# Altium footprint library PcbLib.PcbLib: 108 footprints (part 4 of 7)
Each footprint in its own frame and in the unit in brackets; x right, y up, seen from the top. Pads: shape width x height; smd on the part's side, far side on the other; paste and mask are expansions set on the pad; w line width, h text height; cw(c..) or ccw(c..) is an arc to the next point about the centre after c.
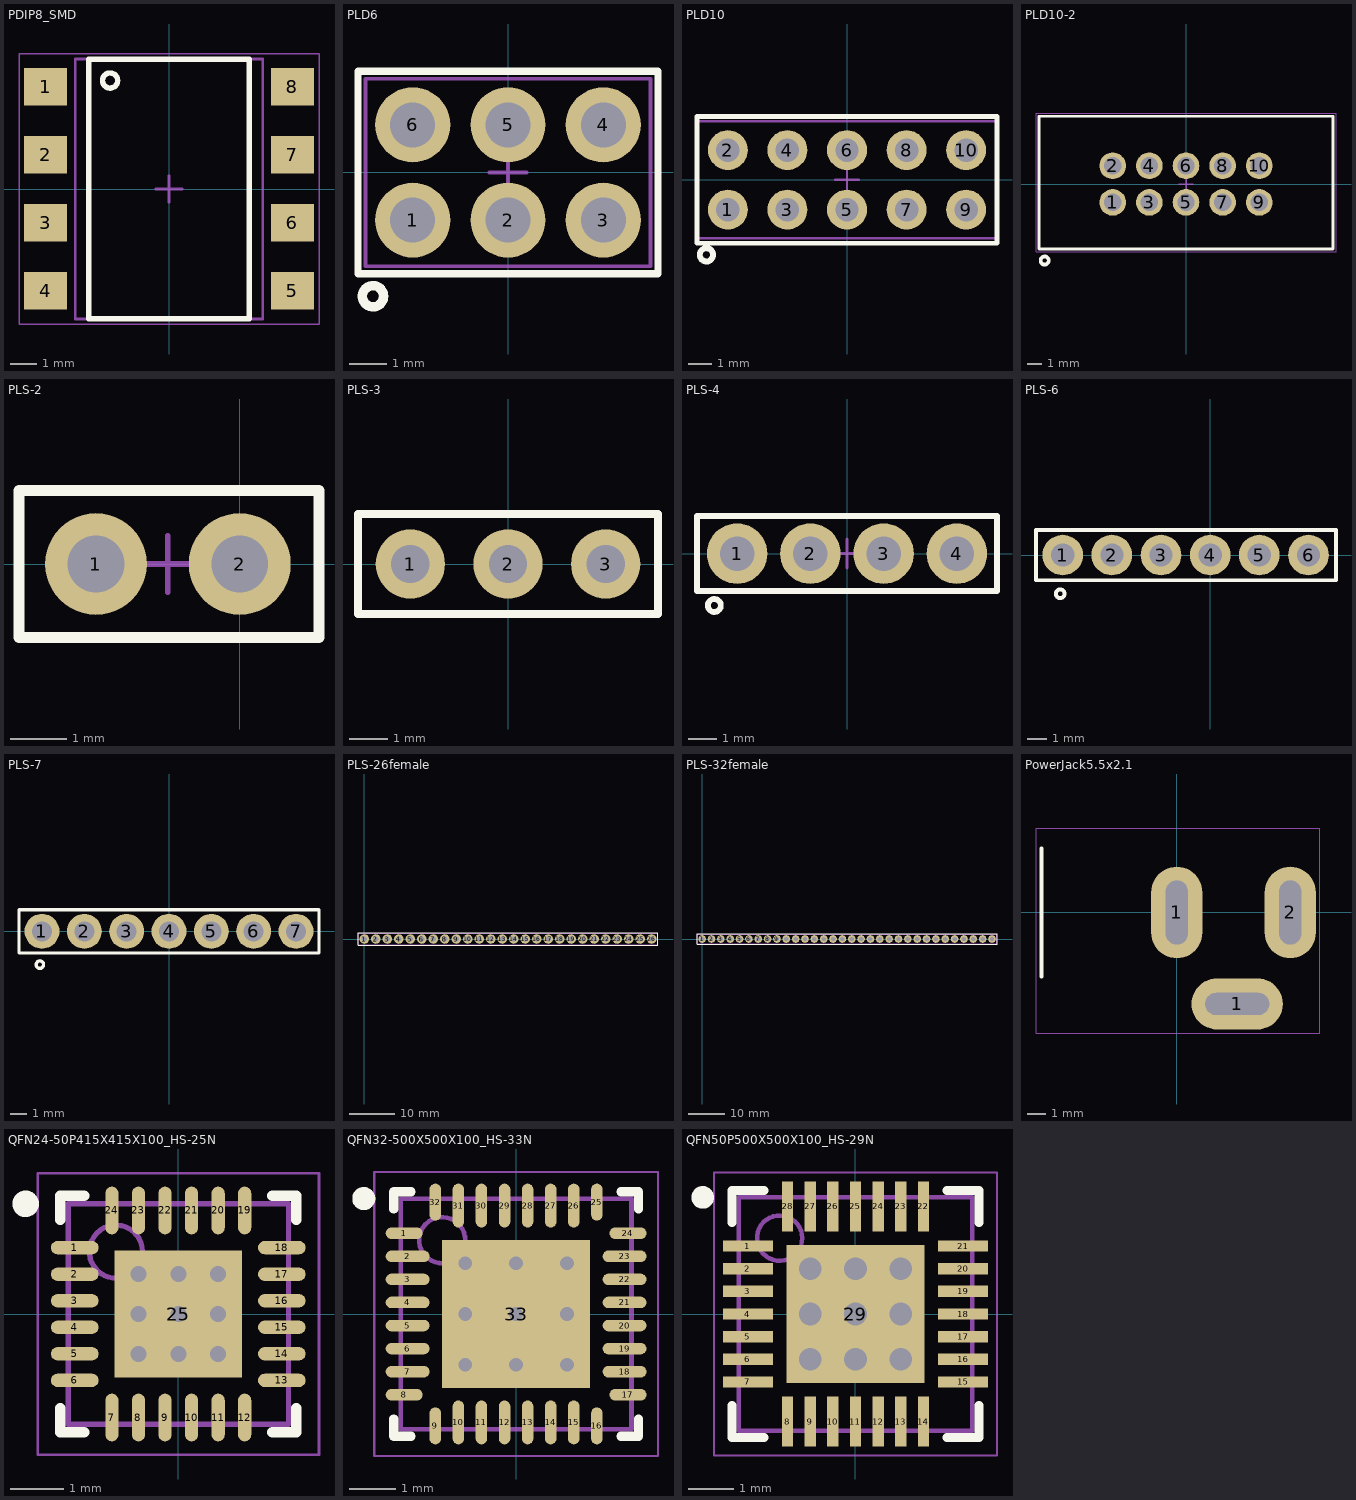
[diagram p3: the footprints below, top view; thin cyan lines are the x and y axes]

## PCBComponent_1 - duplicate [mm]

## PDIP8_SMD [mm]
height 3.5
pads (8):
  rect 1.6x1.4 smd: 1(-4.61,3.82) 2(-4.61,1.28) 3(-4.61,-1.26) 4(-4.61,-3.8) 5(4.61,-3.8) 6(4.61,-1.26) 7(4.61,1.28) 8(4.61,3.82)
Top Overlay:
  circle w0.2: c-2.2,4.05 r0.283
  lines w0.2: -3,-4.85 3,-4.85 3,4.85 -3,4.85 -3,-4.85
Mechanical 13:
  lines w0.05: -5.6,-5.05 -5.6,5.05 5.6,5.05 5.6,-5.05 -5.6,-5.05
  lines w0.1: -0.5,0 0.5,0 ; 0,-0.5 0,0.5
Mechanical 14:
  circle w0.1: c-2.2,4.05 r0.3
  lines w0.1: -3.5,-4.85 3.5,-4.85 3.5,4.85 -3.5,4.85 -3.5,-4.85
3D body "PDIP8_SMD.step": height 4.35, standoff 0.02, extent -4.95,-5 4.95,4.9

## PLD6 [mm]
height 8.65
pads (6):
  round 2 hole 1.2: 1(-2.54,-1.27) 2(0,-1.27) 3(2.54,-1.27) 4(2.54,1.27) 5(0,1.27) 6(-2.54,1.27)
Top Overlay:
  circle w0.254: c-3.6,-3.3 r0.283
  lines w0.2: -4,-2.7 4,-2.7 4,2.7 -4,2.7 -4,-2.7
Mechanical 13:
  lines w0.05: -4,-2.7 4,-2.7 4,2.7 -4,2.7 -4,-2.7
  lines w0.1: -0.5,0 0.5,0 ; 0,-0.5 0,0.5
Mechanical 14:
  lines w0.1: -3.8,-2.5 3.8,-2.5 3.8,2.5 -3.8,2.5 -3.8,-2.5
3D body "User Library-PLD-6 (DS1021-2x3S).step": height 8.65, standoff -2.95, extent -3.81,-2.5 3.81,2.5

## PLD10 [mm]
height 8.65
pads (10):
  round 1.7 / inner round 2 / far side round 2 hole 1: 1(-5.08,-1.27) 2(-5.08,1.27) 3(-2.54,-1.27) 4(-2.54,1.27) 5(0,-1.27) 6(0,1.27) 7(2.54,-1.27) 8(2.54,1.27) 9(5.08,-1.27) 10(5.08,1.27)
Top Overlay:
  circle w0.254: c-6,-3.2 r0.283
  lines w0.2: -6.4,-2.7 -6.4,2.7 6.4,2.7 6.4,-2.7 -6.4,-2.7
Mechanical 13:
  lines w0.05: -6.4,-2.7 -6.4,2.7 6.4,2.7 6.4,-2.7 -6.4,-2.7
  lines w0.1: -0.5,0 0.5,0 ; 0,-0.5 0,0.5
Mechanical 14:
  lines w0.1: -6.4,-2.5 -6.4,2.5 6.4,2.5 6.4,-2.5 -6.4,-2.5
3D body "User Library-PLD-6 (DS1021-2x3S).step": height 8.65, standoff -2.95, extent -3.81,-2.5 3.81,2.5
3D body "User Library-PLD-2-2.step": height 8.65, standoff -2.99, extent 3.73,-2.54 6.27,2.54
3D body "User Library-PLD-2-2.step": height 8.65, standoff -2.99, extent -6.27,-2.54 -3.73,2.54

## PLD10-2 [mm]
height 8.65
pads (10):
  round 1.85 hole 1.2: 1(-5.08,-1.27) 2(-5.08,1.27) 3(-2.54,-1.27) 4(-2.54,1.27) 5(0,-1.27) 6(0,1.27) 7(2.54,-1.27) 8(2.54,1.27) 9(5.08,-1.27) 10(5.08,1.27)
Top Overlay:
  circle w0.254: c-9.8,-5.3 r0.283
  lines w0.2: -10.2,-4.5 10.2,-4.5 10.2,4.7 -10.2,4.7 -10.2,-4.5
Mechanical 13:
  lines w0.05: -10.4,-4.7 10.4,-4.7 10.4,4.9 -10.4,4.9 -10.4,-4.7
  lines w0.1: -0.5,0 0.5,0 ; 0,-0.5 0,0.5
Mechanical 14:
  lines w0.1: -10.2,-4.5 10.2,-4.5 10.2,4.7 -10.2,4.7 -10.2,-4.5
3D body "IDC-10M.STEP": height 10.6, standoff -1.8, extent -10.15,-4.4 10.15,4.7

## PLS-2 [mm]
height 8.64
pads (2):
  round 1.8 hole 1 paste+0: 1(-2.54,0) 2(0,0)
Top Overlay:
  lines w0.2: -3.9,-1.3 1.4,-1.3 1.4,1.3 -3.9,1.3 -3.9,-1.3
Mechanical 13:
  lines w0.05: -3.835,-1.265 1.4,-1.265 1.4,1.275 -3.835,1.275 -3.835,-1.265 ; -3.835,-1.265 -3.835,-1.265
  lines w0.1: -1.8,0 -0.8,0 ; -1.27,-0.5 -1.27,0.5
Mechanical 14:
  lines w0.1: -3.9,-1.3 -3.9,1.3 ; -3.9,-1.3 1.4,-1.3 1.4,1.3 -3.9,1.3 ; -3.9,-1.3 -3.9,1.3
3D body "User Library-PLD-2-2.step": height 8.7, standoff -2.94, extent -3.84,-1.27 1.24,1.27

## PLS-3 [mm]
height 8.64
pads (3):
  round 1.8 hole 1 paste+0: 1(-2.54,0) 2(0,0) 3(2.54,0)
Top Overlay:
  lines w0.2: -3.9,-1.3 -3.9,1.3 3.9,1.3 3.9,-1.3 -3.9,-1.3
Mechanical 13:
  lines w0.05: -3.835,-1.265 -3.835,1.275 3.9,1.275 3.9,-1.265 -3.835,-1.265 ; -3.835,-1.265 -3.835,-1.265
  lines w0.1: -0.5,0 0.5,0 ; 0,-0.5 0,0.5
Mechanical 14:
  lines w0.1: -3.9,-1.3 -3.9,1.3 ; -3.9,-1.3 3.9,-1.3 3.9,1.3 -3.9,1.3 ; -3.9,-1.3 -3.9,1.3
3D body "User Library-PLD-3.step": height 8.7, standoff -2.94, extent -3.8,-1.27 3.82,1.27

## PLS-4 [mm]
height 8.64
pads (4):
  round 2.1 hole 1.2: 1(-3.81,0) 2(-1.27,0) 3(1.27,0) 4(3.81,0)
Top Overlay:
  circle w0.2: c-4.6,-1.8 r0.224
  lines w0.2: -5.2,-1.3 5.2,-1.3 5.2,1.3 -5.2,1.3 -5.2,-1.3
Mechanical 13:
  lines w0.05: -5.135,-1.265 5.2,-1.265 5.2,1.275 -5.135,1.275 -5.135,-1.265 ; -5.135,-1.265 -5.135,-1.265
  lines w0.1: -0.5,0 0.5,0 ; 0,-0.5 0,0.5
Mechanical 14:
  lines w0.1: -5.2,-1.3 -5.2,1.3 ; -5.2,-1.3 5.2,-1.3 5.2,1.3 -5.2,1.3 ; -5.2,-1.3 -5.2,1.3
3D body "User Library-PLD-4-1.step": height 8.7, standoff -2.94, extent -5.08,-1.27 5.08,1.27

## PLS-6 [mm]
height 8.64
pads (6):
  round 2.1 hole 1.2: 1(-7.62,0) 2(-5.08,0) 3(-2.54,0) 4(0,0) 5(2.54,0) 6(5.08,0)
Top Overlay:
  circle w0.2: c-7.75,-2 r0.224
  lines w0.2: -9,-1.3 -9,1.3 6.5,1.3 6.5,-1.3 -9,-1.3
Mechanical 13:
  lines w0.05: -8.95,-1.265 -8.95,1.275 6.5,1.275 6.5,-1.265 -8.95,-1.265
  lines w0.1: -0.5,0 0.5,0 ; 0,-0.5 0,0.5
Mechanical 14:
  lines w0.1: -8.95,-1.3 6.5,-1.3 6.5,1.3 -8.95,1.3
3D body "User Library-PLD-4-1.step": height 8.7, standoff -2.94, extent -8.83,-1.25 1.33,1.29
3D body "User Library-PLD-4-1.step": height 8.7, standoff -2.94, extent -3.76,-1.27 6.4,1.27

## PLS-7 [mm]
height 8.64
pads (7):
  round 2.1 hole 1.2: 1(-7.62,0) 2(-5.08,0) 3(-2.54,0) 4(0,0) 5(2.54,0) 6(5.08,0) 7(7.62,0)
Top Overlay:
  circle w0.2: c-7.75,-2 r0.224
  lines w0.2: -9,-1.3 9,-1.3 9,1.3 -9,1.3 -9,-1.3
Mechanical 13:
  lines w0.05: -8.95,-1.265 9,-1.265 9,1.275 -8.95,1.275 -8.95,-1.265
  lines w0.1: -0.5,0 0.5,0 ; 0,-0.5 0,0.5
Mechanical 14:
  lines w0.1: -8.95,-1.3 9,-1.3 9,1.3 -8.95,1.3
3D body "User Library-PLD-4-1.step": height 8.7, standoff -2.94, extent -1.33,-1.27 8.83,1.27
3D body "User Library-PLD-4-1.step": height 8.7, standoff -2.94, extent -8.83,-1.25 1.33,1.29

## PLS-26female [mm]
height 8.64
pads (26):
  round 2.1 hole 1.2: 1(0,0) 2(2.54,0) 3(5.08,0) 4(7.62,0) 5(10.16,0) 6(12.7,0) 7(15.24,0) 8(17.78,0) 9(20.32,0) 10(22.86,0) 11(25.4,0) 12(27.94,0) 13(30.48,0) 14(33.02,0) 15(35.56,0) 16(38.1,0) 17(40.64,0) 18(43.18,0) 19(45.72,0) 20(48.26,0) 21(50.8,0) 22(53.34,0) 23(55.88,0) 24(58.42,0) 25(60.96,0) 26(63.5,0)
Top Overlay:
  lines w0.2: -1.4,-1.4 -1.4,1.4 64.9,1.4 64.9,-1.4 -1.4,-1.4
Mechanical 13:
  lines w0.05: -1.3,-1.3 64.8,-1.3 64.8,1.3 -1.3,1.3 -1.3,-1.3
  lines w0.1: -0.5,0 0.5,0 ; 0,-0.5 0,0.5
3D body "ds1002-01-1_2v13_asm.STEP": height 3.4, standoff -4, extent 59.69,-1.27 64.77,1.27
3D body "ds1002-01-1_2v13_asm.STEP": height 3.4, standoff -4, extent 54.61,-1.27 59.69,1.27
3D body "ds1002-01-1_2v13_asm.STEP": height 3.4, standoff -4, extent 49.53,-1.27 54.61,1.27
3D body "ds1002-01-1_2v13_asm.STEP": height 3.4, standoff -4, extent 44.45,-1.27 49.53,1.27
3D body "ds1002-01-1_2v13_asm.STEP": height 3.4, standoff -4, extent 39.37,-1.27 44.45,1.27
3D body "ds1002-01-1_2v13_asm.STEP": height 3.4, standoff -4, extent 34.29,-1.27 39.37,1.27
3D body "ds1002-01-1_2v13_asm.STEP": height 3.4, standoff -4, extent 29.21,-1.27 34.29,1.27
3D body "ds1002-01-1_2v13_asm.STEP": height 3.4, standoff -4, extent 24.13,-1.27 29.21,1.27
3D body "ds1002-01-1_2v13_asm.STEP": height 3.4, standoff -4, extent 19.05,-1.27 24.13,1.27
3D body "ds1002-01-1_2v13_asm.STEP": height 3.4, standoff -4, extent 13.97,-1.27 19.05,1.27
3D body "ds1002-01-1_2v13_asm.STEP": height 3.4, standoff -4, extent 8.89,-1.27 13.97,1.27
3D body "ds1002-01-1_2v13_asm.STEP": height 3.4, standoff -4, extent -1.27,-1.27 3.81,1.27
3D body "ds1002-01-1_2v13_asm.STEP": height 3.4, standoff -4, extent 3.81,-1.27 8.89,1.27

## PLS-32female [mm]
height 8.64
pads (32):
  round 2.1 hole 1.2: 1(0,0) 2(2.54,0) 3(5.08,0) 4(7.62,0) 5(10.16,0) 6(12.7,0) 7(15.24,0) 8(17.78,0) 9(20.32,0) 10(22.86,0) 11(25.4,0) 12(27.94,0) 13(30.48,0) 14(33.02,0) 15(35.56,0) 16(38.1,0) 17(40.64,0) 18(43.18,0) 19(45.72,0) 20(48.26,0) 21(50.8,0) 22(53.34,0) 23(55.88,0) 24(58.42,0) 25(60.96,0) 26(63.5,0) 27(66.04,0) 28(68.58,0) 29(71.12,0) 30(73.66,0) 31(76.2,0) 32(78.74,0)
Top Overlay:
  lines w0.2: -1.4,-1.4 -1.4,1.4 80.1,1.4 80.1,-1.4 -1.4,-1.4
Mechanical 13:
  lines w0.05: -1.3,-1.3 80,-1.3 80,1.3 -1.3,1.3 -1.3,-1.3
  lines w0.1: -0.5,0 0.5,0 ; 0,-0.5 0,0.5
3D body "ds1002-01-1_2v13_asm.STEP": height 3.4, standoff -4, extent 74.93,-1.27 80.01,1.27
3D body "ds1002-01-1_2v13_asm.STEP": height 3.4, standoff -4, extent 69.85,-1.27 74.93,1.27
3D body "ds1002-01-1_2v13_asm.STEP": height 3.4, standoff -4, extent 64.77,-1.27 69.85,1.27
3D body "ds1002-01-1_2v13_asm.STEP": height 3.4, standoff -4, extent 59.69,-1.27 64.77,1.27
3D body "ds1002-01-1_2v13_asm.STEP": height 3.4, standoff -4, extent 54.61,-1.27 59.69,1.27
3D body "ds1002-01-1_2v13_asm.STEP": height 3.4, standoff -4, extent 49.53,-1.27 54.61,1.27
3D body "ds1002-01-1_2v13_asm.STEP": height 3.4, standoff -4, extent 44.45,-1.27 49.53,1.27
3D body "ds1002-01-1_2v13_asm.STEP": height 3.4, standoff -4, extent 39.37,-1.27 44.45,1.27
3D body "ds1002-01-1_2v13_asm.STEP": height 3.4, standoff -4, extent 34.29,-1.27 39.37,1.27
3D body "ds1002-01-1_2v13_asm.STEP": height 3.4, standoff -4, extent 29.21,-1.27 34.29,1.27
3D body "ds1002-01-1_2v13_asm.STEP": height 3.4, standoff -4, extent 24.13,-1.27 29.21,1.27
3D body "ds1002-01-1_2v13_asm.STEP": height 3.4, standoff -4, extent 19.05,-1.27 24.13,1.27
3D body "ds1002-01-1_2v13_asm.STEP": height 3.4, standoff -4, extent 13.97,-1.27 19.05,1.27
3D body "ds1002-01-1_2v13_asm.STEP": height 3.4, standoff -4, extent 8.89,-1.27 13.97,1.27
3D body "ds1002-01-1_2v13_asm.STEP": height 3.4, standoff -4, extent -1.27,-1.27 3.81,1.27
3D body "ds1002-01-1_2v13_asm.STEP": height 3.4, standoff -4, extent 3.81,-1.27 8.89,1.27

## PowerJack5.5x2.1 [mm]
height 10
pads (3):
  oval 2.8x5 hole 1.2 slot 3.5 at 90 deg: 1(0,0) 2(6.2,0)
  oval 5x2.8 hole 1.2 slot 3.5 at 0 deg: 1(3.3,-5)
Top Overlay:
  lines w0.2: -7.4,-3.5 -7.4,3.5
Mechanical 13:
  lines w0.05: -7.7,-6.6 7.8,-6.6 7.8,4.6 -7.7,4.6 -7.7,-6.6
  lines w0.1: -0.5,0 0.5,0 ; 0,-0.5 0,0.5
3D body "PJ-002AH5521.STEP": height 11.05, standoff -3.45, extent -7.4,-5.3 7,4.1

## QFN24-50P415X415X100_HS-25N [mm] "QFN, 24-Leads, Body 4,15x4,15mm, Pitch 0,50mm, Thermal Pad 2,50x2,50mm, IPC Medium Density"
height 1
pads (25):
  oval 0.9x0.25 smd: 1(-1.95,1.25) 2(-1.95,0.75) 3(-1.95,0.25) 4(-1.95,-0.25) 5(-1.95,-0.75) 6(-1.95,-1.25) 13(1.95,-1.25) 14(1.95,-0.75) 15(1.95,-0.25) 16(1.95,0.25) 17(1.95,0.75) 18(1.95,1.25)
  oval 0.25x0.9 smd: 7(-1.25,-1.95) 8(-0.75,-1.95) 9(-0.25,-1.95) 10(0.25,-1.95) 11(0.75,-1.95) 12(1.25,-1.95) 19(1.25,1.95) 20(0.75,1.95) 21(0.25,1.95) 22(-0.25,1.95) 23(-0.75,1.95) 24(-1.25,1.95)
  rect 2.4x2.4 smd: 25(0,0)
via -0.75,0.75 diameter 0.5 hole 0.3
via 0.75,0.75 diameter 0.5 hole 0.3
via -0.75,-0.75 diameter 0.5 hole 0.3
via 0,-0.75 diameter 0.5 hole 0.3
via -0.75,0 diameter 0.5 hole 0.3
via 0,0 diameter 0.5 hole 0.3
via 0,0.75 diameter 0.5 hole 0.3
via 0.75,-0.75 diameter 0.5 hole 0.3
via 0.75,0 diameter 0.5 hole 0.3
Top Overlay:
  circle w0.25: c-2.875,2.075 r0.125
  lines w0.2: -2.225,-1.775 -2.225,-2.225 -1.775,-2.225 ; -2.225,1.775 -2.225,2.225 -1.775,2.225 ; 1.775,-2.225 2.225,-2.225 2.225,-1.775 ; 1.775,2.225 2.225,2.225 2.225,1.775
Mechanical 13:
  lines w0.05: -2.65,-2.65 -2.65,2.65 2.65,2.65 2.65,-2.65 -2.65,-2.65
  lines w0.1: -0.5,0 0.5,0 ; 0,-0.5 0,0.5
Mechanical 14:
  circle w0.1: c-1.175,1.175 r0.5
  lines w0.1: -2.075,-2.075 -2.075,2.075 2.075,2.075 2.075,-2.075 -2.075,-2.075
3D body "User Library-qfn-24.step": height 0.88, standoff -0.02, extent -2.025,-2.02 2.015,2.02

## QFN32-500X500X100_HS-33N [mm] "QFN, 32-Leads, Body 5,00x5,00mm, Pitch 0,50mm, Thermal Pad 3,20x3,20mm, IPC Medium Density"
height 1
pads (33):
  oval 0.8x0.25 smd: 1(-2.425,1.75) 8(-2.425,-1.75) 17(2.425,-1.75) 24(2.425,1.75)
  oval 0.95x0.25 smd: 2(-2.35,1.25) 3(-2.35,0.75) 4(-2.35,0.25) 5(-2.35,-0.25) 6(-2.35,-0.75) 7(-2.35,-1.25) 18(2.35,-1.25) 19(2.35,-0.75) 20(2.35,-0.25) 21(2.35,0.25) 22(2.35,0.75) 23(2.35,1.25)
  oval 0.25x0.8 smd: 9(-1.75,-2.425) 16(1.75,-2.425) 25(1.75,2.425) 32(-1.75,2.425)
  oval 0.25x0.95 smd: 10(-1.25,-2.35) 11(-0.75,-2.35) 12(-0.25,-2.35) 13(0.25,-2.35) 14(0.75,-2.35) 15(1.25,-2.35) 26(1.25,2.35) 27(0.75,2.35) 28(0.25,2.35) 29(-0.25,2.35) 30(-0.75,2.35) 31(-1.25,2.35)
  rect 3.2x3.2 smd: 33(0,0)
via 1.1,-1.1 diameter 0.5 hole 0.3
via 0,-1.1 diameter 0.5 hole 0.3
via -1.1,-1.1 diameter 0.5 hole 0.3
via 1.1,0 diameter 0.5 hole 0.3
via 0,0 diameter 0.5 hole 0.3
via -1.1,0 diameter 0.5 hole 0.3
via 1.1,1.1 diameter 0.5 hole 0.3
via 0,1.1 diameter 0.5 hole 0.3
via -1.1,1.1 diameter 0.5 hole 0.3
Top Overlay:
  circle w0.25: c-3.3,2.5 r0.125
  lines w0.2: -2.65,-2.275 -2.65,-2.65 -2.275,-2.65 ; -2.65,2.275 -2.65,2.65 -2.275,2.65 ; 2.275,-2.65 2.65,-2.65 2.65,-2.275 ; 2.275,2.65 2.65,2.65 2.65,2.275
Mechanical 13:
  lines w0.05: -3.075,-3.075 3.075,-3.075 3.075,3.075 -3.075,3.075 -3.075,-3.075
  lines w0.1: -0.5,0 0.5,0 ; 0,-0.5 0,0.5
Mechanical 14:
  circle w0.1: c-1.6,1.6 r0.5
  lines w0.1: -2.5,-2.5 2.5,-2.5 2.5,2.5 -2.5,2.5 -2.5,-2.5
3D body "User Library-QFN32 (FTDI).STEP": height 0.8, standoff -0.05, extent -2.5,-2.5 2.5,2.5

## QFN50P500X500X100_HS-29N [mm] "QFN, 28-Leads, Body 5,00x5,00mm, Pitch 0,50mm, Thermal Pad 3,13x3,13mm, IPC Medium Density"
height 1
pads (29):
  rect 1.1x0.25 smd: 1(-2.375,1.5) 2(-2.375,1) 3(-2.375,0.5) 4(-2.375,0) 5(-2.375,-0.5) 6(-2.375,-1) 7(-2.375,-1.5) 15(2.375,-1.5) 16(2.375,-1) 17(2.375,-0.5) 18(2.375,0) 19(2.375,0.5) 20(2.375,1) 21(2.375,1.5)
  rect 0.25x1.1 smd: 8(-1.5,-2.375) 9(-1,-2.375) 10(-0.5,-2.375) 11(0,-2.375) 12(0.5,-2.375) 13(1,-2.375) 14(1.5,-2.375) 22(1.5,2.375) 23(1,2.375) 24(0.5,2.375) 25(0,2.375) 26(-0.5,2.375) 27(-1,2.375) 28(-1.5,2.375)
  rect 3.05x3.05 smd: 29(0,0)
via 0,0 diameter 0.9 hole 0.5
via 1,0 diameter 0.9 hole 0.5
via 1,1 diameter 0.9 hole 0.5
via 0,1 diameter 0.9 hole 0.5
via -1,1 diameter 0.9 hole 0.5
via -1,0 diameter 0.9 hole 0.5
via -1,-1 diameter 0.9 hole 0.5
via 0,-1 diameter 0.9 hole 0.5
via 1,-1 diameter 0.9 hole 0.5
Top Overlay:
  circle w0.25: c-3.375,2.575 r0.125
  lines w0.2: -2.725,-2.025 -2.725,-2.725 -2.025,-2.725 ; -2.725,2.025 -2.725,2.725 -2.025,2.725 ; 2.025,-2.725 2.725,-2.725 2.725,-2.025 ; 2.025,2.725 2.725,2.725 2.725,2.025
Mechanical 13:
  lines w0.05: -3.125,-3.125 3.125,-3.125 3.125,3.125 -3.125,3.125 -3.125,-3.125
  lines w0.1: -0.5,0 0.5,0 ; 0,-0.5 0,0.5
Mechanical 14:
  circle w0.1: c-1.675,1.675 r0.5
  lines w0.1: -2.575,-2.575 2.575,-2.575 2.575,2.575 -2.575,2.575 -2.575,-2.575
3D body "QFN50P500X500X100_HS-29N.step": height 1, standoff 0, extent -2.655,-2.655 2.655,2.655